# Altium footprint library pcb.PcbLib: 397 footprints (part 7 of 25)
Each footprint in its own frame and in the unit in brackets; x right, y up, seen from the top. Pads: shape width x height; smd on the part's side, far side on the other; paste and mask are expansions set on the pad; w line width, h text height; cw(c..) or ccw(c..) is an arc to the next point about the centre after c.
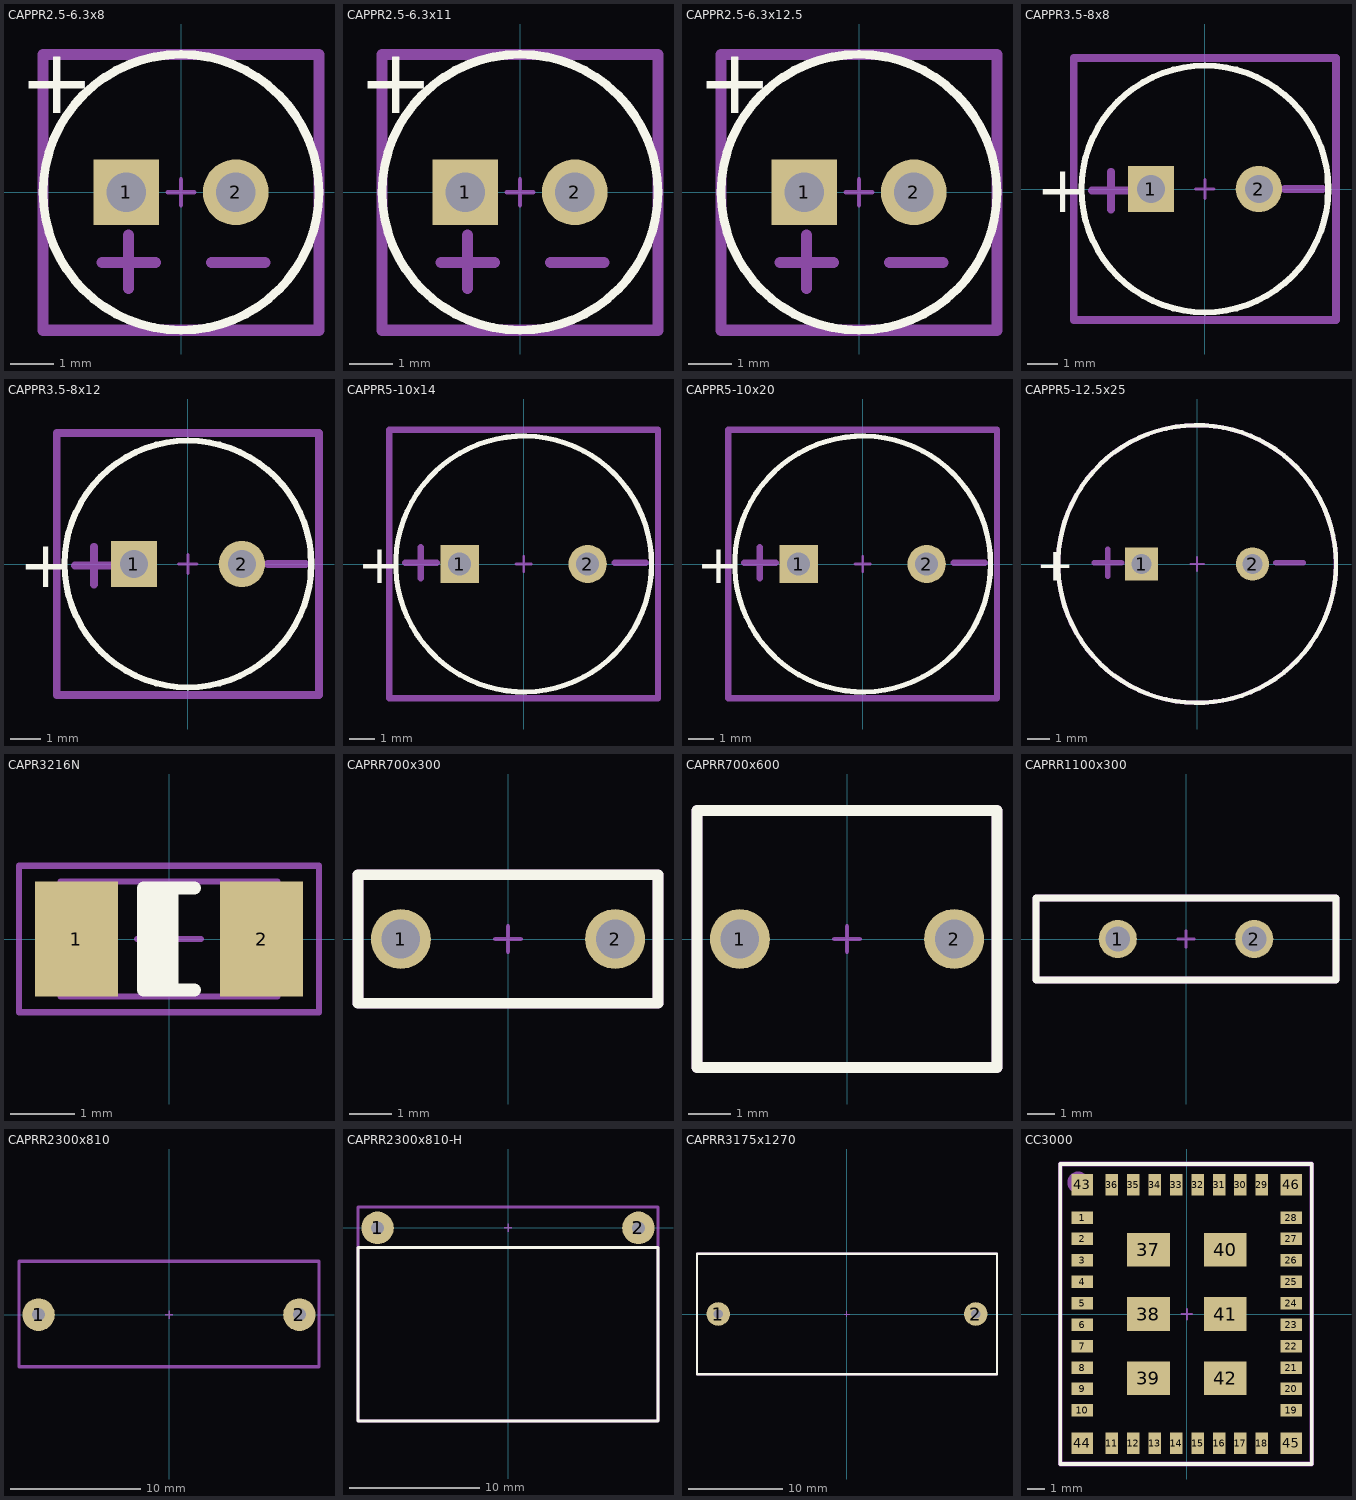
[diagram p6: the footprints below, top view; thin cyan lines are the x and y axes]

## CAPPR2.5-6.3x8 [mm] "Capacitor, Electrolytic, Radial; Body 6.3 x 8 mm (Dia.xH typ); Pin Spacing 2.5 mm (typ)"
height 8
pads (2):
  rect 1.5x1.5 hole 0.9: 1(-1.25,0)
  round 1.5 hole 0.9: 2(1.25,0)
Top Overlay:
  circle w0.2: c0,0 r3.15
  text "+" at -3.7,1.8 h1.5
Mechanical 15:
  lines w0.1: -0.3,0 0.3,0 ; 0,-0.3 0,0.3
  lines w0.254: -1.8,-1.6 -0.581,-1.6 ; -1.2,-2.2 -1.2,-0.981 ; 0.7,-1.6 1.919,-1.6 ; -3.15,-3.15 3.15,-3.15 3.15,3.15 -3.15,3.15 -3.15,-3.15
  text ".Designator" at -3.25,1.25 h1.02
3D body: height 8, standoff 0, extent -3.138,-3.15 3.138,3.138

## CAPPR2.5-6.3x11 [mm] "Capacitor, Electrolytic, Radial; Body 6.3 x 11 mm (Dia.xH typ); Pin Spacing 2.5 mm (typ)"
height 11
pads (2):
  rect 1.5x1.5 hole 0.9: 1(-1.25,0)
  round 1.5 hole 0.9: 2(1.25,0)
Top Overlay:
  circle w0.2: c0,0 r3.15
  text "+" at -3.7,1.8 h1.5
Mechanical 15:
  lines w0.1: -0.3,0 0.3,0 ; 0,-0.3 0,0.3
  lines w0.254: -1.8,-1.6 -0.581,-1.6 ; -1.2,-2.2 -1.2,-0.981 ; 0.7,-1.6 1.919,-1.6 ; -3.15,-3.15 -3.15,3.15 3.15,3.15 3.15,-3.15 -3.15,-3.15
  text ".Designator" at -3.25,1.25 h1.02
3D body: height 11, standoff 0, extent -3.157,-3.155 3.138,3.143

## CAPPR2.5-6.3x12.5 [mm] "Capacitor, Electrolytic, Radial; Body 6.3 x 12.5 mm (Dia.xH typ); Pin Spacing 2.5 mm (typ)"
height 12.5
pads (2):
  rect 1.5x1.5 hole 0.9: 1(-1.25,0)
  round 1.5 hole 0.9: 2(1.25,0)
Top Overlay:
  circle w0.2: c0,0 r3.15
  text "+" at -3.7,1.8 h1.5
Mechanical 15:
  lines w0.1: -0.3,0 0.3,0 ; 0,-0.3 0,0.3
  lines w0.254: -1.8,-1.6 -0.581,-1.6 ; -1.2,-2.2 -1.2,-0.981 ; 0.7,-1.6 1.919,-1.6 ; -3.15,-3.15 -3.15,3.15 3.15,3.15 3.15,-3.15 -3.15,-3.15
  text ".Designator" at -3.25,1.25 h1.02
3D body: height 12.5, standoff 0, extent -3.156,-3.154 3.138,3.142

## CAPPR3.5-8x8 [mm] "Capacitor, Electrolytic, Radial; Body 8 x 8 mm (Dia.xH typ); Pin Spacing 3.5 mm (typ)"
height 13.5
pads (2):
  rect 1.5x1.5 hole 0.9: 1(-1.75,0)
  round 1.5 hole 0.9: 2(1.75,0)
Top Overlay:
  circle w0.2: c0,0 r4
  text "+" at -5.475,-0.75 h1.5
Mechanical 15:
  lines w0.1: -0.3,0 0.3,0 ; 0,-0.3 0,0.3
  lines w0.254: -3.658,-0.051 -2.438,-0.051 ; -3.048,-0.66 -3.048,0.559 ; 2.591,0 3.81,0 ; -4.25,-4.25 4.25,-4.25 4.25,4.25 -4.25,4.25 -4.25,-4.25
  text ".Designator" at -3.25,1.25 h1.02
3D body: height 8, standoff 0, extent -3.937,-3.937 4.031,4.047

## CAPPR3.5-8x12 [mm] "Capacitor, Electrolytic, Radial; Body 8 x 12 mm (Dia.xH typ); Pin Spacing 3.5 mm (typ)"
height 13.5
pads (2):
  rect 1.5x1.5 hole 0.9: 1(-1.75,0)
  round 1.5 hole 0.9: 2(1.75,0)
Top Overlay:
  circle w0.2: c0,0 r4
  text "+" at -5.475,-0.75 h1.5
Mechanical 15:
  lines w0.1: -0.3,0 0.3,0 ; 0,-0.3 0,0.3
  lines w0.254: -3.658,-0.051 -2.438,-0.051 ; -3.048,-0.66 -3.048,0.559 ; 2.591,0 3.81,0 ; -4.25,-4.25 4.25,-4.25 4.25,4.25 -4.25,4.25 -4.25,-4.25
  text ".Designator" at -3.25,1.25 h1.02
3D body: height 12, standoff 0, extent -3.937,-3.937 4.031,4.047

## CAPPR5-10x14 [mm] "Capacitor, Electrolytic, Radial; Body 10 x 14 mm (Dia.xH typ); Pin Spacing 5 mm (typ)"
height 14
pads (2):
  rect 1.5x1.5 hole 0.9: 1(-2.5,0)
  round 1.5 hole 0.9: 2(2.5,0)
Top Overlay:
  circle w0.2: c0,0 r5
  text "+" at -6.475,-0.75 h1.5
Mechanical 15:
  lines w0.1: -0.3,0 0.3,0 ; 0,-0.3 0,0.3
  lines w0.254: -4.623,0.051 -3.404,0.051 ; -4.013,-0.559 -4.013,0.66 ; 3.556,0.051 4.775,0.051 ; -5.25,-5.25 5.25,-5.25 5.25,5.25 -5.25,5.25 -5.25,-5.25
  text ".Designator" at -5,-3.25 h1.02
3D body: height 14, standoff 0, extent -5.04,-5.035 4.953,4.961

## CAPPR5-10x20 [mm] "Capacitor, Electrolytic, Radial; Body 10 x 20 mm (Dia.xH typ); Pin Spacing 5 mm (typ)"
height 22
pads (2):
  rect 1.5x1.5 hole 0.9: 1(-2.5,0)
  round 1.5 hole 0.9: 2(2.5,0)
Top Overlay:
  circle w0.2: c0,0 r5
  text "+" at -6.475,-0.75 h1.5
Mechanical 15:
  lines w0.1: -0.3,0 0.3,0 ; 0,-0.3 0,0.3
  lines w0.254: -4.623,0.051 -3.404,0.051 ; -4.013,-0.559 -4.013,0.66 ; 3.556,0.051 4.775,0.051 ; -5.25,-5.25 -5.25,5.25 5.25,5.25 5.25,-5.25 -5.25,-5.25
  text ".Designator" at -5,-3.25 h1.02
3D body: height 20, standoff 0, extent -5.008,-5.027 4.953,4.953

## CAPPR5-12.5x25 [mm] "Capacitor, Electrolytic, Radial; Body 12.5 x 25 mm (Dia.xH typ); Pin Spacing 5 mm (typ)"
height 25
pads (2):
  rect 1.5x1.5 hole 0.9: 1(-2.5,0)
  round 1.5 hole 0.9: 2(2.5,0)
Top Overlay:
  circle w0.2: c0,0 r6.255
  text "+" at -7.25,-0.75 h1.5
Mechanical 15:
  circle w0.2: c-0.005,0 r6.255
  lines w0.1: -0.3,0 0.3,0 ; 0,-0.3 0,0.3
  lines w0.254: -4.623,0.051 -3.404,0.051 ; -4.013,-0.559 -4.013,0.66 ; 3.556,0.051 4.775,0.051
  text ".Designator" at -5,-3.25 h1.02
3D body: height 25, standoff 0, extent -6.201,-6.238 6.25,6.238

## CAPR3216N [mm] "Chip Capacitor, Body 3.2x1.6mm, IPC Medium Density"
height 2
pads (2):
  rect 1.3x1.8 smd: 1(-1.45,0) 2(1.45,0)
Top Overlay:
  rectangle: -0.4,-0.8 0.15,0.8
  lines w0.2: 0.4,-0.8 -0.4,-0.8 -0.4,0.8 0.4,0.8
Mechanical 13:
  lines w0.1: -1.7,-0.9 1.7,-0.9 1.7,0.9 -1.7,0.9 -1.7,-0.9
Mechanical 15:
  lines w0.1: -0.5,0 0.5,0 ; 0,-0.5 0,0.5 ; -2.35,-1.15 2.35,-1.15 2.35,1.15 -2.35,1.15 -2.35,-1.15
  text "+" at -2.2,1.15 h2
  text ".Designator" at -1.8,-0.9 h1.02
  text "-" at 1.4,1.15 h2
3D body: height 2, standoff 0, extent -1.7,-0.9 1.7,0.9

## CAPRR700x300 [mm]
height 7
pads (2):
  round 1.4 hole 0.9: 1(-2.5,0) 2(2.5,0)
Top Overlay:
  lines w0.254: -3.5,-1.5 3.5,-1.5 3.5,1.5 -3.5,1.5 -3.5,-1.5
Mechanical 15:
  lines w0.1: -0.3,0 0.3,0 ; 0,-0.3 0,0.3
  lines w0.254: -3.5,-1.5 3.5,-1.5 3.5,1.5 -3.5,1.5 -3.5,-1.5
  text ".Designator" at -2.2,-1.2 h1.02
3D body: height 9, standoff 2, extent -3.498,-1.5 3.498,1.5

## CAPRR700x600 [mm]
height 7
pads (2):
  round 1.4 hole 0.9: 1(-2.5,0) 2(2.5,0)
Top Overlay:
  lines w0.254: -3.5,-3 3.5,-3 3.5,3 -3.5,3 -3.5,-3
Mechanical 15:
  lines w0.1: -0.3,0 0.3,0 ; 0,-0.3 0,0.3
  lines w0.254: -3.5,-3 3.5,-3 3.5,3 -3.5,3 -3.5,-3
  text ".Designator" at -2.2,-1.2 h1.02
3D body: height 7, standoff 0, extent -3.498,-3 3.498,3

## CAPRR1100x300 [mm]
height 15
pads (2):
  round 1.4 hole 0.9: 1(-2.5,0) 2(2.5,0)
Top Overlay:
  lines w0.254: -5.5,-1.5 5.5,-1.5 5.5,1.5 -5.5,1.5 -5.5,-1.5
Mechanical 15:
  lines w0.1: -0.3,0 0.3,0 ; 0,-0.3 0,0.3
  lines w0.254: -5.5,-1.5 5.5,-1.5 5.5,1.5 -5.5,1.5 -5.5,-1.5
  text ".Designator" at -2.2,-1.2 h1.02
3D body: height 10.99, standoff 0.01, extent -5.5,-1.5 5.457,1.5

## CAPRR2300x810 [mm]
height 8.1
pads (2):
  round 2.5 hole 1: 1(-10,0) 2(10,0)
Mechanical 15:
  lines w0.1: -0.3,0 0.3,0 ; 0,-0.3 0,0.3
  lines w0.254: -11.5,-4 11.5,-4 11.5,4.1 -11.5,4.1 -11.5,-4
  text ".Designator" at -6.1,-2.3 h1.02
3D body: height 13.3, standoff 0, extent -11.5,-4.1 11.5,4.1

## CAPRR2300x810-H [mm]
height 8.1
pads (2):
  round 2.5 hole 1: 1(-10,0) 2(10,0)
Top Overlay:
  lines w0.254: -11.5,-14.8 11.5,-14.8 11.5,-1.5 -11.5,-1.5 -11.5,-14.8
Mechanical 15:
  lines w0.1: -0.3,0 0.3,0 ; 0,-0.3 0,0.3
  lines w0.254: -11.5,-14.8 11.5,-14.8 11.5,1.6 -11.5,1.6 -11.5,-14.8
  text ".Designator" at -7.4,-5.6 h1.02
3D body: height 8.1, standoff 0, extent -11.5,-14.8 11.5,-1.5

## CAPRR3175x1270 [mm]
height 23
pads (2):
  round 2.5 hole 1: 1(-13.652,0) 2(13.652,0)
Top Overlay:
  lines w0.254: -15.9,-6.4 15.9,-6.4 15.9,6.4 -15.9,6.4 -15.9,-6.4
Mechanical 15:
  lines w0.1: -0.3,0 0.3,0 ; 0,-0.3 0,0.3
  lines w0.254: -15.9,-6.4 15.9,-6.4 15.9,6.4 -15.9,6.4 -15.9,-6.4
  text ".Designator" at -7.4,-5.6 h1.02
3D body: height 23, standoff 0, extent -15.9,-6.4 15.9,6.4

## CC3000 [mm]
height 2
pads (46):
  rect 1.2x0.7 smd: 1(-5.85,5.4) 2(-5.85,4.2) 3(-5.85,3) 4(-5.85,1.8) 5(-5.85,0.6) 6(-5.85,-0.6) 7(-5.85,-1.8) 8(-5.85,-3) 9(-5.85,-4.2) 10(-5.85,-5.4) 19(5.85,-5.4) 20(5.85,-4.2) 21(5.85,-3) 22(5.85,-1.8) 23(5.85,-0.6) 24(5.85,0.6) 25(5.85,1.8) 26(5.85,3) 27(5.85,4.2) 28(5.85,5.4)
  rect 0.7x1.2 smd: 11(-4.2,-7.25) 12(-3,-7.25) 13(-1.8,-7.25) 14(-0.6,-7.25) 15(0.6,-7.25) 16(1.8,-7.25) 17(3,-7.25) 18(4.2,-7.25) 29(4.2,7.25) 30(3,7.25) 31(1.8,7.25) 32(0.6,7.25) 33(-0.6,7.25) 34(-1.8,7.25) 35(-3,7.25) 36(-4.2,7.25)
  rect 2.4x1.9 smd: 37(-2.15,3.6) 38(-2.15,0) 39(-2.15,-3.6) 40(2.15,3.6) 41(2.15,0) 42(2.15,-3.6)
  rect 1.2x1.2 smd: 43(-5.85,7.25) 44(-5.85,-7.25) 45(5.85,-7.25) 46(5.85,7.25)
Top Overlay:
  lines w0.2: -7.1,-8.4 7,-8.4 7,8.4 -7.1,8.4 -7.1,-8.4
Mechanical 15:
  circle w1: c-6.097,7.37 r0.1
  lines w0.1: -0.3,0 0.3,0 ; 0,-0.3 0,0.3
  lines w0.254: -7.1,-8.4 7,-8.4 7,8.4 -7.1,8.4 -7.1,-8.4
  text ".Designator" at -5.8,-7.5 h1.02
3D body: height 2, standoff 0, extent -6.9,-8.2 6.8,8.2